# Altium schematic symbol library Electronic Devices_LIB.SchLib: 703 symbols (part 4 of 8) (continued)
## IC_MPU_8M_PLUS_MIMX8ML8DVNLZAB (continued)
part K pins: AC25 ENET_TD0, AD24 ENET_TD3, AE24 ENET_TXC, AE26 ENET_TD1, AE28 ENET_RX_CTL, AE29 ENET_RXC, AF24 ENET_TX_CTL, AF26 ENET_TD2, AF28 ENET_RD3, AF29 ENET_RD2, AG28 ENET_RD1, AG29 ENET_RD0, AH28 ENET_MDC, AH29 ENET_MDIO
part L pins: A3 GPIO1_IO06, A4 GPIO1_IO14, A5 GPIO1_IO12, A6 GPIO1_IO13, A7 GPIO1_IO00, A8 GPIO1_IO08, AC8 I2C1_SCL, AC20 ECSPI1_MOSI, AD6 UART1_RXD, AD8 I2C4_SDA, AD20 ECSPI1_MISO, AE6 UART3_RXD, AE8 I2C2_SDA, AE20 ECSPI1_SS0, AF6 UART2_RXD, AF8 I2C4_SCL, AF20 ECSPI1_SCLK, AH4 UART2_TXD, AH5 UART4_TXD, AH6 I2C2_SCL, AH7 I2C1_SDA, AH20 ECSPI2_MISO, AH21 ECSPI2_SCLK, AJ3 UART1_TXD, AJ4 UART3_TXD, AJ5 UART4_RXD, AJ6 I2C3_SDA, AJ7 I2C3_SCL, AJ21 ECSPI2_MOSI, AJ22 ECSPI2_SS0, B4 GPIO1_IO05, B5 GPIO1_IO15, B6 GPIO1_IO02, B7 GPIO1_IO10, B8 GPIO1_IO09, D6 GPIO1_IO03, D8 GPIO1_IO11, E6 GPIO1_IO04, E8 GPIO1_IO01, F6 GPIO1_IO07
part M pins: F8 BOOT_MODE1, F14 JTAG_TDO, F22 PMIC_ON_REQ, G8 BOOT_MODE2, G10 BOOT_MODE0, G12 BOOT_MODE3, G14 JTAG_TMS, G16 JTAG_TDI, G18 JTAG_TCK, G20 JTAG_MOD, G22 ONOFF, G25 XTALI_24M, G26 XTALO_24M, J24 PMIC_STBY_REQ, J25 RTC_XTALI, J26 RTC_XTALO, J29 POR_B, K28 CLKIN1, K29 CLKOUT1, L28 CLKIN2, L29 CLKOUT2
part N pins: AA8 NVCC_DRAM_2 (power), AA10 NVCC_DRAM_1 (power), AA11 NVCC_SAI2_SAI3_SPDIF (power), AA14 NVCC_ECSPI_HDMI (power), AA16 PVCC2_1P8 (power), AA19 PVCC1_1P8 (power), AA20 VDD_EARC_1P8 (power), AA22 VDD_HDMI_1P8 (power), AA24 NVCC_ENET (power), F20 VDD_MIPI_1P2_CAP (power), J8 NVCC_DRAM_4 (power), J10 NVCC_DRAM_3 (power), J11 NVCC_GPIO (power), J14 VDD_USB_3P3, J16 PVCC0_1P8 (power), J19 VDD_USB_1P8, J20 VDD_ANA0_1P8 (power), J22 VDD_LVDS_1P8 (power), K10 VDD_SOC_1 (power), K11 NVCC_JTAG (power), K14 VDD_USB_0P8, K15 VDD_PCI_0P8 (power), K16 VDD_MIPI_0P8 (power), K19 VDD_PCI_1P8 (power), K20 VDD_MIPI_1P8 (power), L8 NVCC_DRAM_5 (power), L9 VDD_SOC_11 (power), L10 VDD_SOC_2 (power), L11 VDD_SOC_3 (power), L12 VDD_SOC_4 (power), L13 VDD_SOC_5 (power), L17 VDD_SOC_6 (power), L18 VDD_SOC_7 (power), L19 VDD_SOC_8 (power), L20 VDD_SOC_9 (power), L21 VDD_SOC_10 (power), L22 VDD_24M_XTAL_1P8 (power), M14 VDD_SOC_12 (power), M16 VDD_SOC_13 (power), N8 NVCC_DRAM_6 (power), N9 VDD_SOC_28 (power), N10 VDD_SOC_14 (power), N12 VDD_SOC_15 (power), N13 VDD_SOC_16 (power), N14 VDD_SOC_34 (power), N15 VDD_SOC_33 (power), N16 VDD_SOC_32 (power), N17 VDD_SOC_31 (power), N18 VDD_SOC_30 (power), N20 VDD_SOC_29 (power), N21 VDD_SOC_35 (power), N22 VDD_ANA1_1P8 (power), N26 VDD_SNVS_0P8_CAP (power), P14 VDD_SOC_27 (power), P16 VDD_SOC_26 (power), R6 VDD_DRAM_PLL_1P8 (power), R8 NVCC_DRAM_7 (power), R9 VDD_DRAM_PLL_0P8 (power), R10 VDD_SOC_25 (power), R20 VDD_SOC_24 (power), R21 VDD_ANA1_0P8 (power), R22 NVCC_CLK (power), R24 NVCC_SNVS_1P8 (power), T14 VDD_ARM_1 (power), T16 VDD_ARM_2 (power), U8 NVCC_DRAM_8 (power), U9 VDD_SOC_20 (power), U10 VDD_SOC_23 (power), U12 VDD_ARM_3 (power), U13 VDD_ARM_4 (power), U14 VDD_ARM_5 (power), U15 VDD_ARM_6 (power), U16 VDD_ARM_7 (power), U17 VDD_ARM_8 (power), U20 VDD_SOC_22 (power), U21 VDD_SAI_PLL_0P8 (power), U22 NVCC_NAND (power), U24 NVCC_SD1 (power), V14 VDD_ARM_9 (power), V16 VDD_ARM_10 (power), W8 NVCC_DRAM_9 (power), W9 VDD_SOC_17 (power), W10 VDD_SOC_19 (power), W11 VDD_SOC_18 (power), W12 VDD_ARM_11 (power), W13 VDD_ARM_12 (power), W17 VDD_ARM_13 (power), W18 VDD_SAI_PLL_1P8 (power), W19 VDD_AVPLL_1P8 (power), W20 VDD_SOC_21 (power), W21 VDD_ARM_PLL_0P8 (power), W22 VDD_HDMI_0P8 (power), W24 NVCC_SD2 (power), Y10 NVCC_I2C_UART (power), Y11 NVCC_SAI1_SAI5 (power), Y14 VDD_ARM_14 (power), Y15 VDD_ARM_15 (power), Y16 VDD_ARM_16 (power), Y19 VDD_ARM_PLL_1P8 (power), Y20 VDD_ANA2_1P8 (power)
part O pins: A1 VSS12 (power), A29 VSS46 (power), AA3 VSS49 (power), AA7 VSS50 (power), AA23 VSS47 (power), AA27 VSS48 (power), AB8 VSS59 (power), AB10 VSS51 (power), AB12 VSS52 (power), AB14 VSS53 (power), AB16 VSS54 (power), AB18 VSS56 (power), AB20 VSS57 (power), AB22 VSS58 (power), AC3 VSS62 (power), AC6 VSS63 (power), AC24 VSS60 (power), AC27 VSS61 (power), AE3 VSS65 (power), AE27 VSS64 (power), AG4 VSS76 (power), AG6 VSS78 (power), AG8 VSS79 (power), AG10 VSS67 (power), AG12 VSS68 (power), AG14 VSS69 (power), AG16 VSS70 (power), AG18 VSS71 (power), AG20 VSS72 (power), AG22 VSS73 (power), AG24 VSS74 (power), AG26 VSS75 (power), AJ1 VSS80 (power), AJ29 VSS81 (power), C4 VSS92 (power), C6 VSS93 (power), C8 VSS94 (power), C10 VSS82 (power), C12 VSS83 (power), C14 VSS84 (power), C16 VSS85 (power), C18 VSS86 (power), C20 VSS87 (power), C22 VSS89 (power), C24 VSS90 (power), C26 VSS91 (power), E3 VSS96 (power), E27 VSS95 (power), G3 VSS11 (power), G6 VSS98 (power), G24 VSS97 (power), G27 VSS10 (power), H8 VSS107 (power), H10 VSS100 (power), H12 VSS101 (power), H14 VSS102 (power), H16 VSS103 (power), H18 VSS104 (power), H20 VSS105 (power), H22 VSS106 (power), J3 VSS3 (power), J7 VSS4 (power), J23 VSS108 (power), J27 VSS109 (power), L3 VSS9 (power), L7 VSS1 (power), L14 VSS5 (power), L16 VSS6 (power), L23 VSS7 (power), L27 VSS8 (power), M11 VSS22 (power), M19 VSS33 (power), N3 VSS88 (power), N7 VSS99 (power), N11 VSS44 (power), N19 VSS55 (power), N23 VSS66 (power), N27 VSS77 (power), P11 VSS2 (power), P19 VSS13 (power), R3 VSS25 (power), R7 VSS26 (power), R11 VSS14 (power), R12 VSS15 (power), R13 VSS16 (power), R14 VSS17 (power), R16 VSS18 (power), R17 VSS19 (power), R18 VSS20 (power), R19 VSS21 (power), R23 VSS23 (power), R27 VSS24 (power), T11 VSS27 (power), T19 VSS28 (power), U3 VSS35 (power), U7 VSS36 (power), U11 VSS29 (power), U18 VSS30 (power), U19 VSS31 (power), U23 VSS32 (power), U27 VSS34 (power), V11 VSS37 (power), V19 VSS38 (power), W3 VSS43 (power), W7 VSS45 (power), W14 VSS39 (power), W16 VSS40 (power), W23 VSS41 (power), W27 VSS42 (power)

## IC_MPU_32BIT_1.8GHZ_MIMX8MM6DVTLZAA
designator U?, comment MIMX8MM6DVTLZAA
MPU i.MX8MM RISC 32-Bit 1.8GHz 486-Pin FCBGA Tray; Manufacturer: NXP Semiconductors; Supplier 1: Mouser; Manufacturer Part Number: MIMX8MM6DVTLZAA; RoHS: Yes; Category: Microprocessors; Stock 1: 224; Pricing 1: 1=39.41, 10=32.52, 50=32.52, 100=28.33, 250=28.32, 1000=28.32, 10000=28.32 (USD); RoHS Compliant: Yes; ComponentLink1URL: http://www.farnell.com/datasheets/2786355.pdf?src-supplier=Farnell; ComponentLink1Description: http://www.farnell.com/datasheets/2786355.pdf?src-supplier=Farnell; ComponentLink2URL: http://www.farnell.com/datasheets/2786355.pdf?src-supplier=Element14; ComponentLink2Description: http://www.farnell.com/datasheets/2786355.pdf?src-supplier=Element14; ComponentLink3URL: https://datasheet.octopart.com/MIMX8MM6DVTLZAA-NXP-Semiconductors-datasheet-151889143.pdf?src-supplier=Future+Electronics; ComponentLink3Description: https://datasheet.octopart.com/MIMX8MM6DVTLZAA-NXP-Semiconductors-datasheet-151889143.pdf?src-supplier=Future+Electronics; ComponentLink4URL: http://www.farnell.com/datasheets/2786355.pdf?src-supplier=Newark; ComponentLink4Description: http://www.farnell.com/datasheets/2786355.pdf?src-supplier=Newark; Supplier Part Number 1: 771-MIMX8MM6DVTLZAA
footprint IC_MPU_BGA486C50P27X27_1400X1400X125 (486-LFBGA (14x14))
part A pins: A1 VSS_1, A2 DRAM_DQS0_P, A3 DRAM_DQ06, A4 DRAM_DM0, A5 DRAM_DQ00, A6 ECSPI2_SS0, A7 ECSPI1_MISO, A8 ECSPI2_MISO, A9 MIPI_DSI_D0_N, A10 MIPI_DSI_D1_N, A11 MIPI_DSI_CLK_N, A12 MIPI_DSI_D2_N, A13 MIPI_DSI_D3_N, A14 MIPI_CSI_D0_N, A15 MIPI_CSI_D1_N, A16 MIPI_CSI_CLK_N, A17 MIPI_CSI_D2_N, A18 MIPI_CSI_D3_N, A19 PCIE_RXN_N, A20 PCIE_TXN_N, A21 PCIE_CLK_N, A22 USB1_DN, A23 USB2_DN, A24 PMIC_ON_REQ, A25 ONOFF, A26 RTC_XTALI, A27 VSS_2, AA1 DRAM_DQS2_P, AA2 DRAM_DQ17, AA7 VSS_77, AA9 VSS_78, AA10 VSS_79, AA13 VSS_80, AA14 VDD_ANA0_1P8_2, AA15 VSS_81, AA18 VSS_82, AA19 VSS_83, AA21 VSS_84, AA26 SD2_CD_B, AA27 SD2_WP, AB1 DRAM_DM2, AB2 DRAM_DQ16, AB3 VSS_85, AB4 DRAM_AC20, AB5 DRAM_AC21, AB6 DRAM_AC38, AB9 GPIO1_IO15, AB10 GPIO1_IO12, AB13 PVCC0_1P8, AB15 SAI5_RXFS, AB18 SAI1_MCLK, AB19 SAI1_TXFS, AB22 SAI2_RXC, AB23 SD2_DATA0, AB24 SD2_DATA1, AB25 VSS_86, AB26 SD2_RESET_B, AB27 ENET_MDIO, AC1 DRAM_DQ22, AC2 DRAM_DQ23, AC3 VSS_87, AC4 DRAM_AC30, AC6 SAI3_TXFS, AC9 GPIO1_IO14, AC10 GPIO1_IO11, AC13 SAI5_RXD3, AC14 SAI5_RXD1, AC15 SAI5_RXC, AC18 SAI1_TXC, AC19 SAI2_RXFS, AC22 SAI2_TXD0, AC24 SAI2_RXD0, AC25 VSS_88, AC26 ENET_RD3, AC27 ENET_MDC, AD1 DRAM_DQ27, AD2 DRAM_DQ26, AD5 DRAM_AC31, AD6 SAI3_MCLK, AD9 GPIO1_IO13, AD10 GPIO1_IO10, AD13 SAI5_RXD2, AD15 SAI5_MCLK, AD18 SAI5_RXD0, AD19 SAI2_MCLK, AD22 SAI2_TXC, AD23 SAI2_TXFS, AD26 ENET_RD2, AD27 ENET_RD1, AE1 DRAM_DQ28, AE2 VSS_89, AE5 VSS_90, AE6 VSS_91, AE9 VSS_92, AE10 VSS_93, AE13 VSS_94, AE14 VSS_95, AE15 VSS_96, AE18 VSS_97, AE19 VSS_98, AE22 VSS_99, AE23 VSS_100, AE26 ENET_RXC, AE27 ENET_RD0, AF1 DRAM_DQ29, AF2 DRAM_DQS3_N, AF3 VSS_101, AF4 DRAM_DQ31, AF5 DRAM_DQ25, AF6 SAI3_TXD, AF7 SAI3_RXD, AF8 SPDIF_EXT_CLK, AF9 SPDIF_TX, AF10 GPIO1_IO09, AF11 GPIO1_IO07, AF12 GPIO1_IO05, AF13 GPIO1_IO03, AF14 GPIO1_IO01, AF15 SAI1_RXD1, AF16 SAI1_RXC, AF17 SAI1_RXD3, AF18 SAI1_RXD5, AF19 SAI1_RXD7, AF20 SAI1_TXD1, AF21 SAI1_TXD3, AF22 SAI1_TXD5, AF23 SAI1_TXD7, AF24 ENET_TX_CTL, AF25 ENET_TD3, AF26 ENET_TD1, AF27 ENET_RX_CTL, AG1 VSS_102, AG2 DRAM_DQS3_P, AG3 DRAM_DQ30, AG4 DRAM_DM3, AG5 DRAM_DQ24, AG6 SAI3_TXC, AG7 SAI3_RXC, AG8 SAI3_RXFS, AG9 SPDIF_RX, AG10 GPIO1_IO08, AG11 GPIO1_IO06, AG12 GPIO1_IO04, AG13 GPIO1_IO02, AG14 GPIO1_IO00, AG15 SAI1_RXD0, AG16 SAI1_RXFS, AG17 SAI1_RXD2, AG18 SAI1_RXD4, AG19 SAI1_RXD6, AG20 SAI1_TXD0, AG21 SAI1_TXD2, AG22 SAI1_TXD4, AG23 SAI1_TXD6, AG24 ENET_TXC, AG25 ENET_TD2, AG26 ENET_TD0, AG27 VSS_103, B1 DRAM_DQ05, B2 DRAM_DQS0_N, B3 VSS_3, B4 DRAM_DQ07, B5 DRAM_DQ01, B6 ECSPI1_SS0, B7 ECSPI1_MOSI, B8 ECSPI2_MOSI, B9 MIPI_DSI_D0_P, B10 MIPI_DSI_D1_P, B11 MIPI_DSI_CLK_P, B12 MIPI_DSI_D2_P, B13 MIPI_DSI_D3_P, B14 MIPI_CSI_D0_P, B15 MIPI_CSI_D1_P, B16 MIPI_CSI_CLK_P, B17 MIPI_CSI_D2_P, B18 MIPI_CSI_D3_P, B19 PCIE_RXN_P, B20 PCIE_TXN_P, B21 PCIE_CLK_P, B22 USB1_DP, B23 USB2_DP, B24 POR_B, B25 RTC_XTALO, B26 VSS_4, B27 24M_XTALI, C1 DRAM_DQ04, C2 VSS_5, C5 VSS_6, C6 VSS_7, C9 VSS_8, C10 VSS_9, C13 VSS_10, C14 VSS_11, C15 VSS_12, C18 VSS_13, C19 VSS_14, C22 VSS_15, C23 VSS_16, C26 24M_XTALO, C27 JTAG_TRST_B, D1 DRAM_DQ03, D2 DRAM_DQ02, D5 DRAM_AC11, D6 ECSPI1_SCLK, D9 I2C2_SDA, D10 I2C2_SCL, D13 I2C4_SCL, D15 MIPI_VREG_CAP, D18 UART3_TXD, D19 PCIE_RESREF, D22 USB1_ID, D23 USB2_ID, D26 TEST_MODE, D27 JTAG_MOD, E1 DRAM_DQ14, E2 DRAM_DQ15, E3 VSS_17, E4 DRAM_AC10, E6 ECSPI2_SCLK, E9 I2C1_SCL, E10 I2C3_SCL, E13 I2C4_SDA, E14 UART1_RXD, E15 UART2_TXD, E18 UART3_RXD, E19 USB1_TXRTUNE, E22 USB2_TXRTUNE, E24 PMIC_STBY_REQ, E25 VSS_18, E26 JTAG_TDO, E27 JTAG_TDI, F1 DRAM_DM1, F2 DRAM_DQ08, F3 VSS_19, F4 DRAM_AC00, F5 DRAM_AC01, F6 DRAM_AC06, F9 I2C1_SDA, F10 I2C3_SDA, F13 UART1_TXD, F15 UART2_RXD, F18 UART4_TXD, F19 UART4_RXD, F22 USB1_VBUS, F23 USB2_VBUS, F24 RTC_RESET_B, F25 VSS_20, F26 JTAG_TCK, F27 JTAG_TMS, G1 DRAM_DQS1_P, G2 DRAM_DQ09, G7 VSS_21, G9 VSS_22, G10 VSS_23, G13 VSS_24, G14 VDD_PCI_1P8, G15 VSS_25, G18 VSS_26, G19 VSS_27, G21 VSS_28, G26 BOOT_MODE0, G27 BOOT_MODE1, H1 DRAM_DQS1_N, H2 VSS_29, H10 NVCC_ECSPI, H13 VDD_MIPI_1P8, H15 VDD_USB_1P8, H18 VSS_30, H26 CLKOUT1, H27 CLKIN1, J1 DRAM_DQ10, J2 DRAM_DQ11, J3 VSS_31, J4 DRAM_AC03, J5 DRAM_AC07, J6 DRAM_AC08, J7 VSS_32, J10 VDD_DRAM_1, J11 NVCC_I2C, J12 NVCC_UART, J13 PVCC2_1P8, J14 VDD_MIPI_0P9, J15 VDD_MIPI_1P2, J16 VDD_PCI_0P8, J17 VDD_USB_0P8, J18 NC, J21 VSS_33, J22 NVCC_SNVS_1P8, J23 TSENSOR_TEST_OUT, J24 TSENSOR_REST_EXT, J25 VSS_34, J26 CLKOUT2, J27 CLKIN2, K1 DRAM_DQ13, K2 DRAM_DQ12, K3 VSS_35, K4 DRAM_AC02, K5 DRAM_AC14, K6 DRAM_AC09, K7 VSS_36, K8 NVCC_DRAM_1, K9 NVCC_DRAM_2, K12 VDD_VPU_1, K13 VDD_VPU_2, K15 VDD_SOC_1, K16 VDD_SOC_2, K19 VDD_USB_3P3, K20 VSS_37, K21 VSS_38, K22 VDD_SNVS_0P8, K23 NAND_DATA02, K24 NAND_DATA01, K25 VSS_39, K26 NAND_DATA06, K27 NAND_CLE, L1 DRAM_AC05, L2 DRAM_AC04, L9 NVCC_DRAM_3, L10 VDD_DRAM_2, L11 VDD_VPU_3, L12 VSS_40, L13 VDD_VPU_4, L15 VDD_SOC_3, L16 VSS_41, L17 VDD_ANA_0P8_1, L18 VDD_SOC_4, L19 NVCC_JTAG, L26 NAND_DATA05, L27 NAND_CE3_B, M1 DRAM_AC16, M2 DRAM_AC17, M9 NVCC_DRAM_4, M12 VSS_42, M13 VDD_VPU_5, M14 VDD_VPU_6, M15 VDD_SOC_5, M16 VSS_43, M19 NVCC_CLK, M26 NAND_DATA04, M27 NAND_CE2_B, N1 DRAM_AC26, N2 DRAM_AC19, N3 VSS_44, N4 DRAM_AC12, N5 DRAM_AC13, N6 DRAM_AC15, N7 VSS_45, N8 NVCC_DRAM_5, N9 NVCC_DRAM_6, N10 VDD_DRAM_3, N11 VDD_VPU_7, N12 VSS_46, N13 VDD_SOC_6, N15 VDD_SOC_7, N16 VSS_47, N17 VDD_ANA_0P8_2, N18 VDD_SOC_8, N19 VDD_24M_XTAL_1P8, N20 VDD_ANA1_1P8_1, N21 VSS_48, N22 NAND_ALE, N23 NAND_DATA03, N24 NAND_CE0_B, N25 VSS_49, N26 NAND_DATA07, N27 NAND_RE_B, P1 DRAM_VREF, P2 DRAM_ZN, P3 VSS_50, P5 VDD_DRAM_PLL_1P8, P7 NVCC_DRAM_7, P9 VDD_DRAM_PLL_0P8, P12 VDD_GPU_1, P13 VSS_51, P15 VSS_52, P16 VDD_ARM_PLL_0P8, P19 VDD_ANA1_1P8_2, P21 VSS_53, P23 NAND_DATA00, P25 VSS_54, P26 NAND_READY_B, P27 NAND_CE1_B, R1 DRAM_RESET_N, R2 DRAM_ALERT_N, R3 VSS_55, R4 DRAM_AC32, R5 DRAM_AC33, R6 DRAM_AC27, R7 VSS_56, R8 NVCC_DRAM_8, R9 NVCC_DRAM_9, R10 VDD_DRAM_4, R11 VDD_GPU_2, R12 VSS_57, R13 VDD_ARM_1, R15 VDD_ARM_2, R16 VSS_58, R17 VDD_SOC_9, R18 VDD_SOC_10, R19 VDD_ARM_PLL_1P8, R20 VSS_59, R21 VSS_60, R22 NAND_DQS, R23 SD1_RESET_B, R24 SD1_STROBE, R25 VSS_61, R26 NAND_WE_B, R27 NAND_WP_B, T1 DRAM_AC34, T2 DRAM_AC35, T9 NVCC_DRAM_10, T12 VSS_62, T13 VDD_ARM_3, T14 VDD_ARM_4, T15 VDD_ARM_5, T16 VSS_63, T19 PVCC1_1P8, T26 SD1_DATA3, T27 SD1_DATA2, U1 DRAM_AC25, U2 DRAM_AC24, U9 NVCC_DRAM_11, U10 VDD_DRAM_5, U11 VDD_GPU_3, U12 VSS_64, U13 VDD_ARM_6, U15 VDD_ARM_7, U16 VSS_65, U17 VDD_SOC_11, U18 VDD_SOC_12, U19 NVCC_NAND, U26 SD1_DATA5, U27 SD1_DATA4, V1 DRAM_DQ21, V2 DRAM_DQ20, V3 VSS_66, V4 DRAM_AC23, V5 DRAM_AC36, V6 DRAM_AC29, V7 VSS_67, V8 NVCC_DRAM_12, V9 NVCC_DRAM_13, V12 VDD_GPU_4, V13 VDD_ARM_8, V15 VDD_ARM_9, V16 VDD_ARM_10, V19 NVCC_SAI2, V20 NVCC_SD1, V21 VSS_68, V22 NVCC_SD2, V23 SD2_DATA3, V24 SD2_DATA2, V25 VSS_69, V26 SD1_CLK, V27 SD1_CMD, W1 DRAM_DQ18, W2 DRAM_DQ19, W3 VSS_70, W4 DRAM_AC22, W5 DRAM_AC37, W6 DRAM_AC28, W7 VSS_71, W10 VDD_DRAM_6, W11 VDD_GPU_5, W12 NVCC_GPIO1, W13 VDD_ARM_11, W14 VDD_ARM_12, W15 VDD_ARM_13, W16 VDD_ARM_14, W17 NVCC_SAI5, W18 NVCC_SAI1, W21 VSS_72, W22 NVCC_ENET, W23 SD2_CLK, W24 SD2_CMD, W25 VSS_73, W26 SD1_DATA7, W27 SD1_DATA6, Y1 DRAM_DQS2_N, Y2 VSS_74, Y10 NVCC_SAI3, Y13 VSS_75, Y15 VDD_ANA0_1P8_1, Y18 VSS_76, Y26 SD1_DATA1, Y27 SD1_DATA0

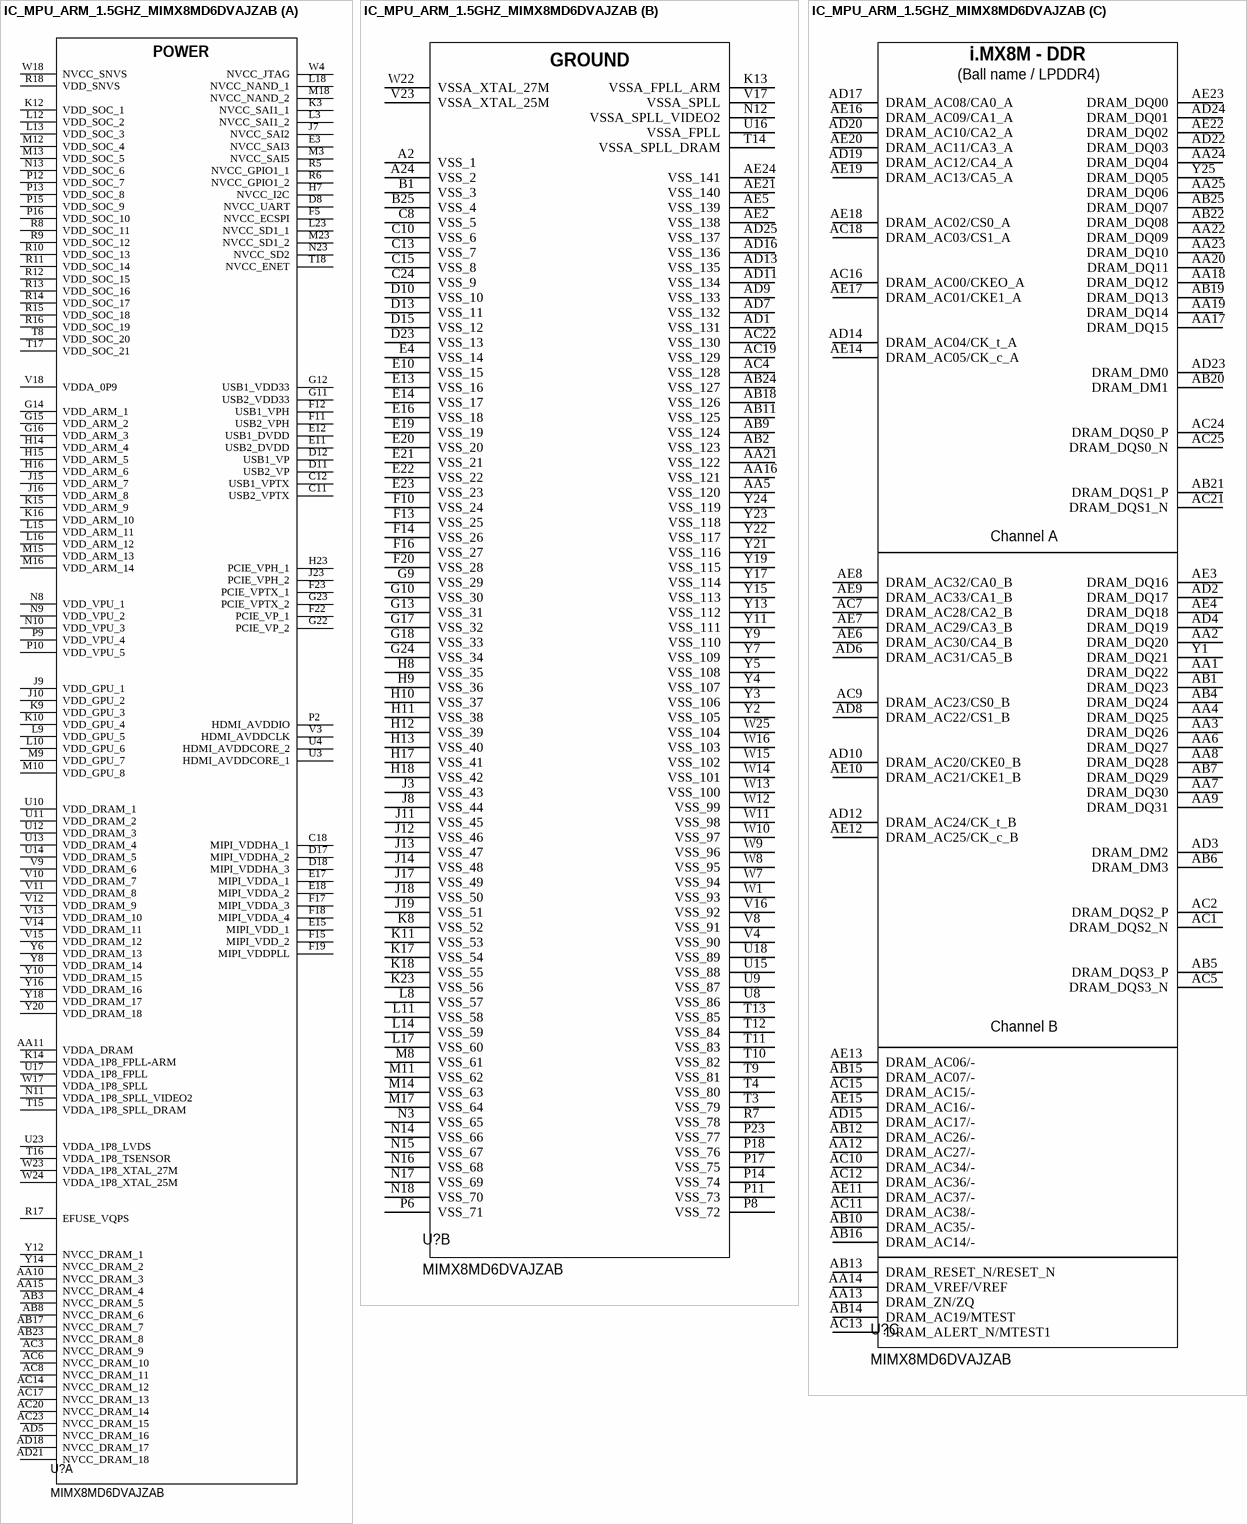
[diagram p18: symbol IC_MPU_ARM_1.5GHZ_MIMX8MD6DVAJZAB]

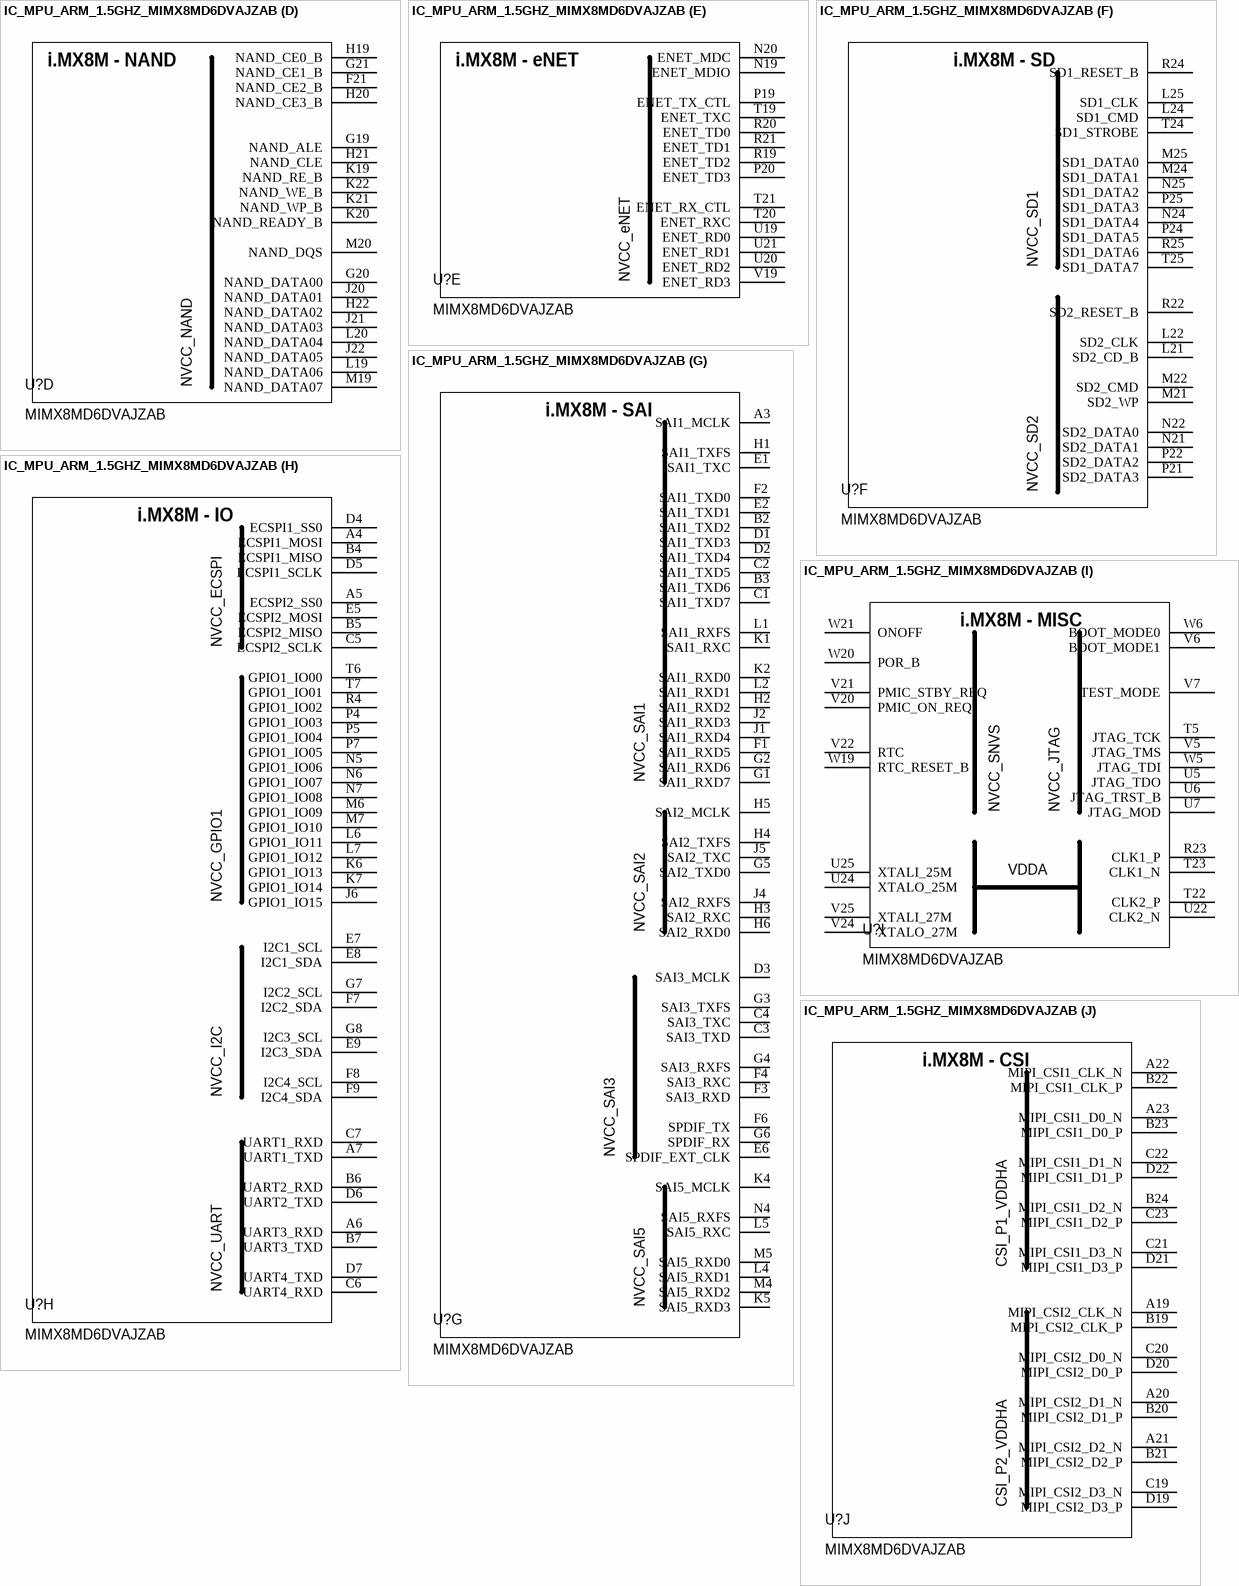
[diagram p19: symbol IC_MPU_ARM_1.5GHZ_MIMX8MD6DVAJZAB]

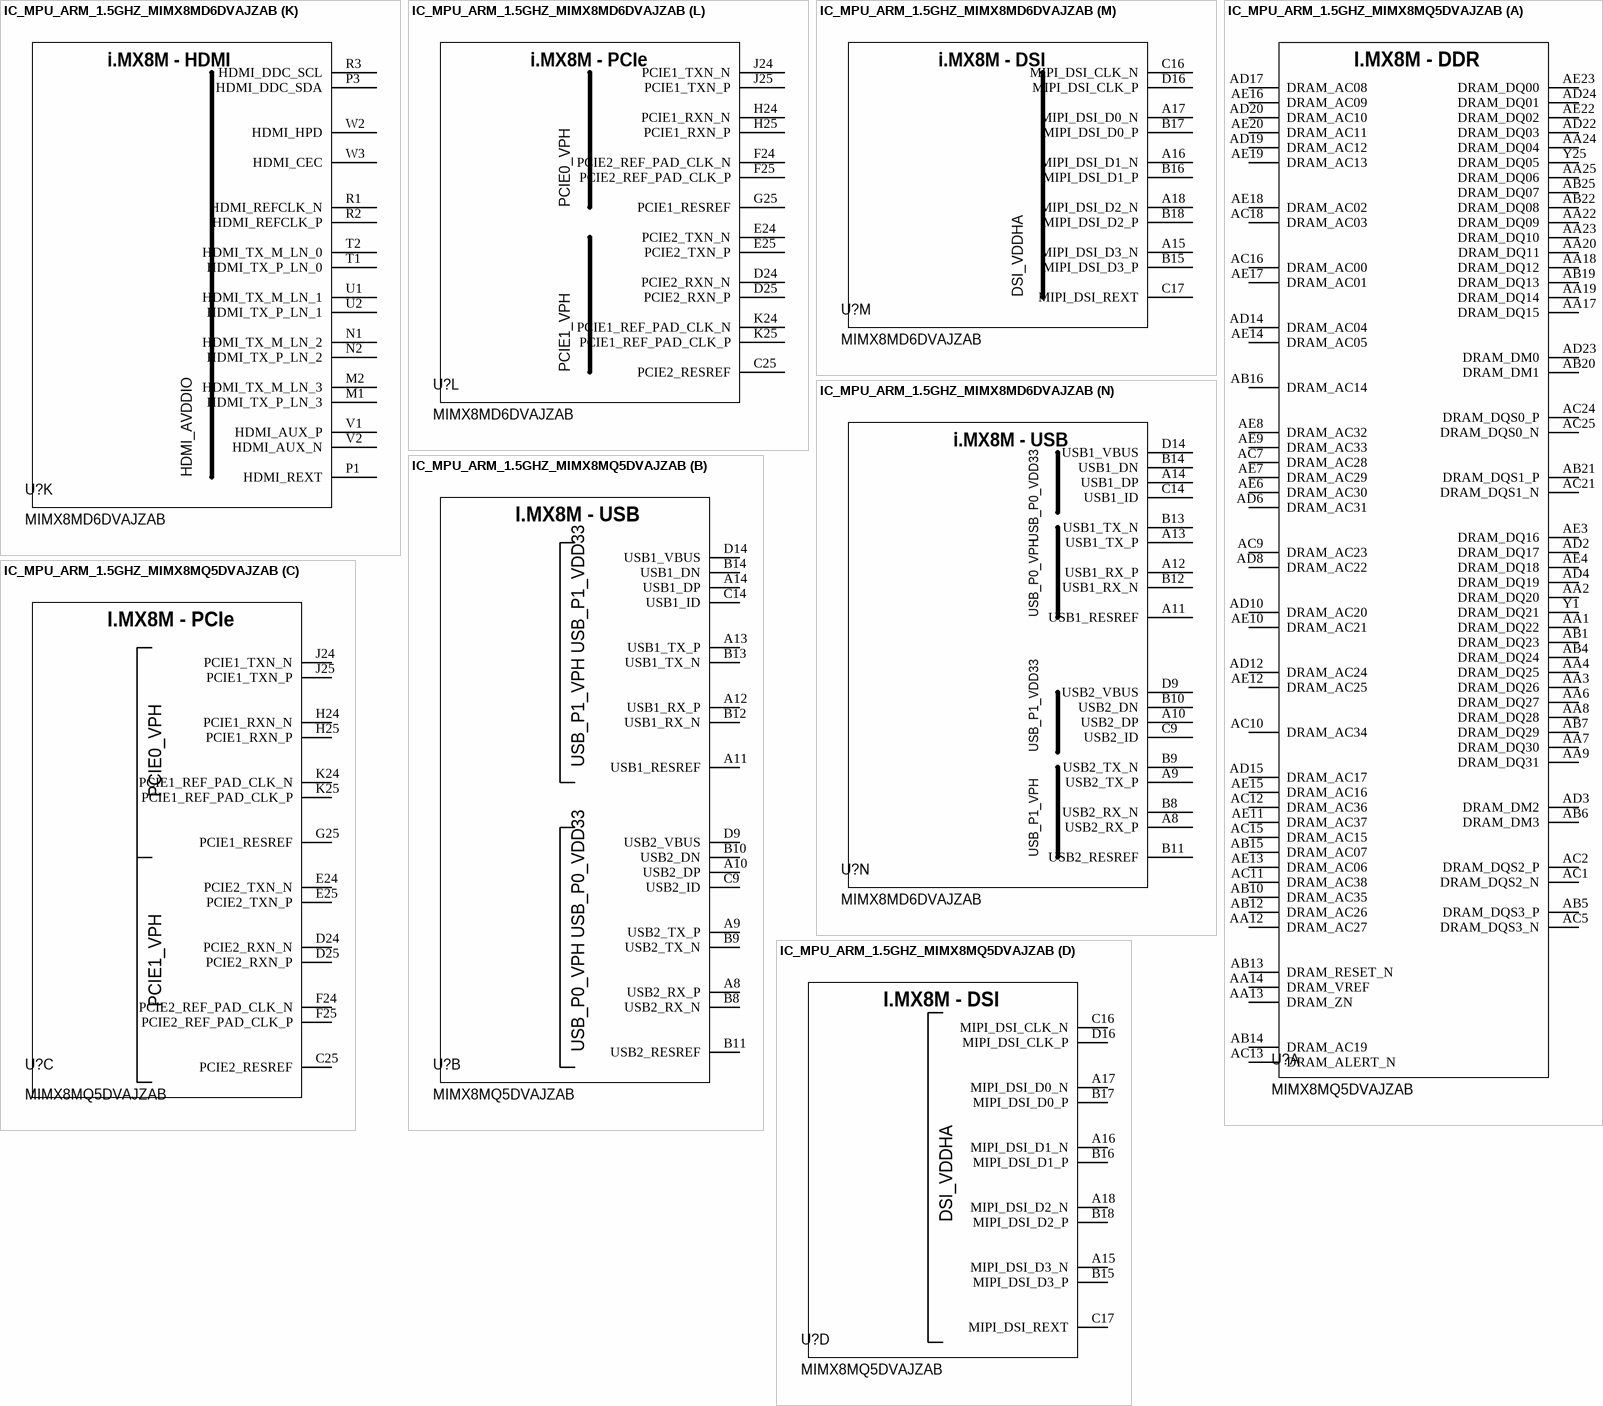
[diagram p20: symbols IC_MPU_ARM_1.5GHZ_MIMX8MD6DVAJZAB to IC_MPU_ARM_1.5GHZ_MIMX8MQ5DVAJZAB]

## IC_MPU_ARM_1.5GHZ_MIMX8MD6DVAJZAB
designator U?, comment MIMX8MD6DVAJZAB
i.MX 8M: Cortex-A53 up to 1.5GHz and Cortex-M4 / TRAY TRAY MULTIPLE DP BAKEABLE RoHS Compliant: Yes; Manufacturer: NXP Semiconductors; Supplier 1: Digikey; Manufacturer Part Number: MIMX8MD6DVAJZAB; RoHS: Yes; Category: Microprocessors; Stock 1: 162; Pricing 1: 1=56.07, 10=46.184, 25=43.716, 90=41.175 (USD); RoHS Compliant: Yes; Supplier Part Number 1: 568-14717-ND
footprint IC_MPU_BGA621C65P25X25_1700X1700X218 (621-FCPBGA (17x17))
part A pins: AA10 NVCC_DRAM_3, AA11 VDDA_DRAM, AA15 NVCC_DRAM_4, AB3 NVCC_DRAM_5, AB8 NVCC_DRAM_6, AB17 NVCC_DRAM_7, AB23 NVCC_DRAM_8, AC3 NVCC_DRAM_9, AC6 NVCC_DRAM_10, AC8 NVCC_DRAM_11, AC14 NVCC_DRAM_12, AC17 NVCC_DRAM_13, AC20 NVCC_DRAM_14, AC23 NVCC_DRAM_15, AD5 NVCC_DRAM_16, AD18 NVCC_DRAM_17, AD21 NVCC_DRAM_18, C11 USB2_VPTX, C12 USB1_VPTX, C18 MIPI_VDDHA_1, D8 NVCC_UART, D11 USB2_VP, D12 USB1_VP, D17 MIPI_VDDHA_2, D18 MIPI_VDDHA_3, E3 NVCC_SAI3, E11 USB2_DVDD, E12 USB1_DVDD, E15 MIPI_VDD_1, E17 MIPI_VDDA_1, E18 MIPI_VDDA_2, F5 NVCC_ECSPI, F11 USB2_VPH, F12 USB1_VPH, F15 MIPI_VDD_2, F17 MIPI_VDDA_3, F18 MIPI_VDDA_4, F19 MIPI_VDDPLL, F22 PCIE_VP_1, F23 PCIE_VPTX_1, G11 USB2_VDD33, G12 USB1_VDD33, G14 VDD_ARM_1, G15 VDD_ARM_2, G16 VDD_ARM_3, G22 PCIE_VP_2, G23 PCIE_VPTX_2, H7 NVCC_I2C, H14 VDD_ARM_4, H15 VDD_ARM_5, H16 VDD_ARM_6, H23 PCIE_VPH_1, J7 NVCC_SAI2, J9 VDD_GPU_1, J10 VDD_GPU_2, J15 VDD_ARM_7, J16 VDD_ARM_8, J23 PCIE_VPH_2, K3 NVCC_SAI1_1, K9 VDD_GPU_3, K10 VDD_GPU_4, K12 VDD_SOC_1, K14 VDDA_1P8_FPLL-ARM, K15 VDD_ARM_9, K16 VDD_ARM_10, L3 NVCC_SAI1_2, L9 VDD_GPU_5, L10 VDD_GPU_6, L12 VDD_SOC_2, L13 VDD_SOC_3, L15 VDD_ARM_11, L16 VDD_ARM_12, L18 NVCC_NAND_1, L23 NVCC_SD1_1, M3 NVCC_SAI5, M9 VDD_GPU_7, M10 VDD_GPU_8, M12 VDD_SOC_4, M13 VDD_SOC_5, M15 VDD_ARM_13, M16 VDD_ARM_14, M18 NVCC_NAND_2, M23 NVCC_SD1_2, N8 VDD_VPU_1, N9 VDD_VPU_2, N10 VDD_VPU_3, N11 VDDA_1P8_SPLL_VIDEO2, N13 VDD_SOC_6, N23 NVCC_SD2, P2 HDMI_AVDDIO, P9 VDD_VPU_4, P10 VDD_VPU_5, P12 VDD_SOC_7, P13 VDD_SOC_8, P15 VDD_SOC_9, P16 VDD_SOC_10, R5 NVCC_GPIO1_1, R6 NVCC_GPIO1_2, R8 VDD_SOC_11, R9 VDD_SOC_12, R10 VDD_SOC_13, R11 VDD_SOC_14, R12 VDD_SOC_15, R13 VDD_SOC_16, R14 VDD_SOC_17, R15 VDD_SOC_18, R16 VDD_SOC_19, R17 EFUSE_VQPS, R18 VDD_SNVS, T8 VDD_SOC_20, T15 VDDA_1P8_SPLL_DRAM, T16 VDDA_1P8_TSENSOR, T17 VDD_SOC_21, T18 NVCC_ENET, U3 HDMI_AVDDCORE_1, U4 HDMI_AVDDCORE_2, U10 VDD_DRAM_1, U11 VDD_DRAM_2, U12 VDD_DRAM_3, U13 VDD_DRAM_4, U14 VDD_DRAM_5, U17 VDDA_1P8_FPLL, U23 VDDA_1P8_LVDS, V3 HDMI_AVDDCLK, V9 VDD_DRAM_6, V10 VDD_DRAM_7, V11 VDD_DRAM_8, V12 VDD_DRAM_9, V13 VDD_DRAM_10, V14 VDD_DRAM_11, V15 VDD_DRAM_12, V18 VDDA_0P9, W4 NVCC_JTAG, W17 VDDA_1P8_SPLL, W18 NVCC_SNVS, W23 VDDA_1P8_XTAL_27M, W24 VDDA_1P8_XTAL_25M, Y6 VDD_DRAM_13, Y8 VDD_DRAM_14, Y10 VDD_DRAM_15, Y12 NVCC_DRAM_1, Y14 NVCC_DRAM_2, Y16 VDD_DRAM_16, Y18 VDD_DRAM_17, Y20 VDD_DRAM_18
part B pins: A2 VSS_1, A24 VSS_2, AA5 VSS_120, AA16 VSS_121, AA21 VSS_122, AB2 VSS_123, AB9 VSS_124, AB11 VSS_125, AB18 VSS_126, AB24 VSS_127, AC4 VSS_128, AC19 VSS_129, AC22 VSS_130, AD1 VSS_131, AD7 VSS_132, AD9 VSS_133, AD11 VSS_134, AD13 VSS_135, AD16 VSS_136, AD25 VSS_137, AE2 VSS_138, AE5 VSS_139, AE21 VSS_140, AE24 VSS_141, B1 VSS_3, B25 VSS_4, C8 VSS_5, C10 VSS_6, C13 VSS_7, C15 VSS_8, C24 VSS_9, D10 VSS_10, D13 VSS_11, D15 VSS_12, D23 VSS_13, E4 VSS_14, E10 VSS_15, E13 VSS_16, E14 VSS_17, E16 VSS_18, E19 VSS_19, E20 VSS_20, E21 VSS_21, E22 VSS_22, E23 VSS_23, F10 VSS_24, F13 VSS_25, F14 VSS_26, F16 VSS_27, F20 VSS_28, G9 VSS_29, G10 VSS_30, G13 VSS_31, G17 VSS_32, G18 VSS_33, G24 VSS_34, H8 VSS_35, H9 VSS_36, H10 VSS_37, H11 VSS_38, H12 VSS_39, H13 VSS_40, H17 VSS_41, H18 VSS_42, J3 VSS_43, J8 VSS_44, J11 VSS_45, J12 VSS_46, J13 VSS_47, J14 VSS_48, J17 VSS_49, J18 VSS_50, J19 VSS_51, K8 VSS_52, K11 VSS_53, K13 VSSA_FPLL_ARM, K17 VSS_54, K18 VSS_55, K23 VSS_56, L8 VSS_57, L11 VSS_58, L14 VSS_59, L17 VSS_60, M8 VSS_61, M11 VSS_62, M14 VSS_63, M17 VSS_64, N3 VSS_65, N12 VSSA_SPLL_VIDEO2, N14 VSS_66, N15 VSS_67, N16 VSS_68, N17 VSS_69, N18 VSS_70, P6 VSS_71, P8 VSS_72, P11 VSS_73, P14 VSS_74, P17 VSS_75, P18 VSS_76, P23 VSS_77, R7 VSS_78, T3 VSS_79, T4 VSS_80, T9 VSS_81, T10 VSS_82, T11 VSS_83, T12 VSS_84, T13 VSS_85, T14 VSSA_SPLL_DRAM, U8 VSS_86, U9 VSS_87, U15 VSS_88, U16 VSSA_FPLL, U18 VSS_89, V4 VSS_90, V8 VSS_91, V16 VSS_92, V17 VSSA_SPLL, V23 VSSA_XTAL_25M, W1 VSS_93, W7 VSS_94, W8 VSS_95, W9 VSS_96, W10 VSS_97, W11 VSS_98, W12 VSS_99, W13 VSS_100, W14 VSS_101, W15 VSS_102, W16 VSS_103, W22 VSSA_XTAL_27M, W25 VSS_104, Y2 VSS_105, Y3 VSS_106, Y4 VSS_107, Y5 VSS_108, Y7 VSS_109, Y9 VSS_110, Y11 VSS_111, Y13 VSS_112, Y15 VSS_113, Y17 VSS_114, Y19 VSS_115, Y21 VSS_116, Y22 VSS_117, Y23 VSS_118, Y24 VSS_119
part C pins: AA1 DRAM_DQ22, AA2 DRAM_DQ20, AA3 DRAM_DQ26, AA4 DRAM_DQ25, AA6 DRAM_DQ27, AA7 DRAM_DQ30, AA8 DRAM_DQ28, AA9 DRAM_DQ31, AA12 DRAM_AC27/-, AA13 DRAM_ZN/ZQ, AA14 DRAM_VREF/VREF, AA17 DRAM_DQ15, AA18 DRAM_DQ12, AA19 DRAM_DQ14, AA20 DRAM_DQ11, AA22 DRAM_DQ09, AA23 DRAM_DQ10, AA24 DRAM_DQ04, AA25 DRAM_DQ06, AB1 DRAM_DQ23, AB4 DRAM_DQ24, AB5 DRAM_DQS3_P, AB6 DRAM_DM3, AB7 DRAM_DQ29, AB10 DRAM_AC35/-, AB12 DRAM_AC26/-, AB13 DRAM_RESET_N/RESET_N, AB14 DRAM_AC19/MTEST, AB15 DRAM_AC07/-, AB16 DRAM_AC14/-, AB19 DRAM_DQ13, AB20 DRAM_DM1, AB21 DRAM_DQS1_P, AB22 DRAM_DQ08, AB25 DRAM_DQ07, AC1 DRAM_DQS2_N, AC2 DRAM_DQS2_P, AC5 DRAM_DQS3_N, AC7 DRAM_AC28/CA2_B, AC9 DRAM_AC23/CS0_B, AC10 DRAM_AC34/-, AC11 DRAM_AC38/-, AC12 DRAM_AC36/-, AC13 DRAM_ALERT_N/MTEST1, AC15 DRAM_AC15/-, AC16 DRAM_AC00/CKEO_A, AC18 DRAM_AC03/CS1_A, AC21 DRAM_DQS1_N, AC24 DRAM_DQS0_P, AC25 DRAM_DQS0_N, AD2 DRAM_DQ17, AD3 DRAM_DM2, AD4 DRAM_DQ19, AD6 DRAM_AC31/CA5_B, AD8 DRAM_AC22/CS1_B, AD10 DRAM_AC20/CKE0_B, AD12 DRAM_AC24/CK_t_B, AD14 DRAM_AC04/CK_t_A, AD15 DRAM_AC17/-, AD17 DRAM_AC08/CA0_A, AD19 DRAM_AC12/CA4_A, AD20 DRAM_AC10/CA2_A, AD22 DRAM_DQ03, AD23 DRAM_DM0, AD24 DRAM_DQ01, AE3 DRAM_DQ16, AE4 DRAM_DQ18, AE6 DRAM_AC30/CA4_B, AE7 DRAM_AC29/CA3_B, AE8 DRAM_AC32/CA0_B, AE9 DRAM_AC33/CA1_B, AE10 DRAM_AC21/CKE1_B, AE11 DRAM_AC37/-, AE12 DRAM_AC25/CK_c_B, AE13 DRAM_AC06/-, AE14 DRAM_AC05/CK_c_A, AE15 DRAM_AC16/-, AE16 DRAM_AC09/CA1_A, AE17 DRAM_AC01/CKE1_A, AE18 DRAM_AC02/CS0_A, AE19 DRAM_AC13/CA5_A, AE20 DRAM_AC11/CA3_A, AE22 DRAM_DQ02, AE23 DRAM_DQ00, Y1 DRAM_DQ21, Y25 DRAM_DQ05